# Altium schematic symbol library IC_ADI.SCHLIB: 3169 symbols (part 120 of 181)
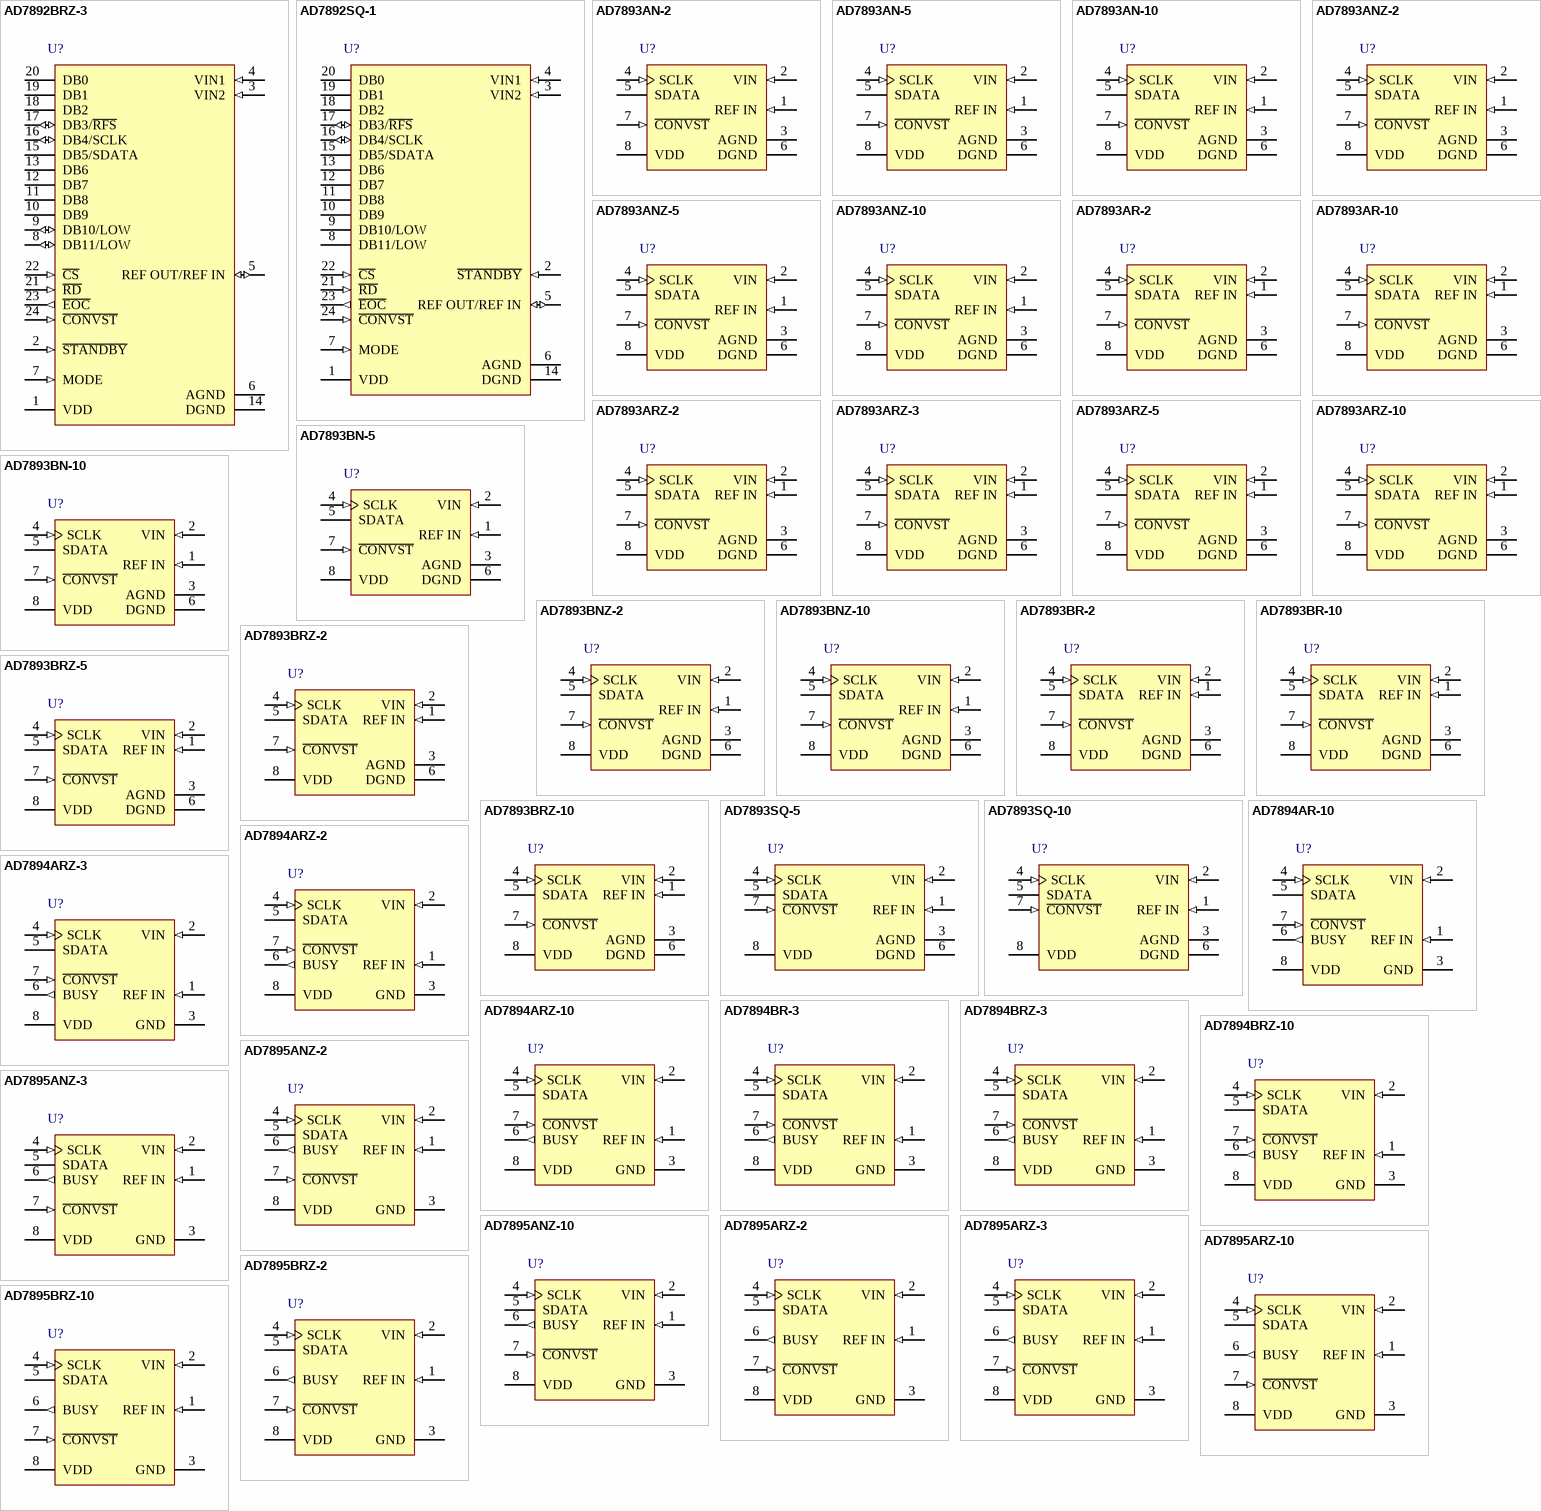
[diagram p310: symbols AD7892BRZ-3 to AD7895BRZ-10]

## AD7895ANZ-3
designator U?
Single 12-Bit Analog-to-Digital Converter with Serial Interface, Serial 3.8 us, 192KSPS, -40 to +125 degC, N-8, Pb-Free, Tube; Generic Part Number: AD7895; PartNumber: AD7895ANZ-3; Resolution (Bits): 12; Channels: 1; Throughput Rate (SPS): 192K; Interface: Ser; DatasheetVersion: Rev.0; PackageVersion: 070606-A; PackageReference: N-8; PackageDescription: 8-Lead Plastic Dual In-Line Package [PDIP] Narrow Body; Supplier Part Number 1: AD7895ANZ-3-ND; Supplier Part Number 2: 584-AD7895ANZ-3; RoHS: Y; Packing: Tube; Mounting Technology: Through-hole; Code_JEDEC: MS-001; ComponentLink1Description: Manufacturer URL; ComponentLink2Description: Datasheet; ComponentLink3Description: Package Specification; ComponentLink4Description: Product URL
footprint DIP8 (Footprint not found)
pins: 1 REF IN (in) "Voltage Reference Input.  An external reference source should be connected to this pin to provide the reference voltage for the AD7895's conversion process. The REF IN input is buffered on chip. The nominal reference voltage (See Datasheet)", 2 VIN (in) "Analog Input Channel.  The analog input range is +/- 10 V (AD7895-10), +/- 2.5 V (AD7895-3) and 0 V to +/- 2.5 V (AD7895-2).", 3 GND (power) "Analog Ground. Ground reference for track/hold, comparator, digital circuitry and DAC.", 4 SCLK (in) "Serial Clock Input.   An external serial clock is applied to this input to obtain serial data from the AD7895.A new serial data bit is clocked out on the falling edge of this serial clock. Data is guaranteed valid for 10 ns (See Datasheet)", 5 SDATA (hiz) "Serial Data Output.  Serial data from the AD7895 is provided at this output. The serial data is clocked out by the falling edge of SCLK, but the data can also be read on the falling edge of SCLK. This is possible because (See Datasheet)", 6 BUSY (out) "The BUSY pin is used to indicate when the part is doing a conversion.  The BUSY pin will go high on the falling edge of C\O\N\V\S\T\ and will return low when the conversion is complete.", 7 ~{CONVST} (in) "Convert Start.  Edge-triggered logic input. On the falling edge of this input, the track/hold goes into its hold mode, and conversion is initiated.  If C\O\N\V\S\T\ is low at the end of conversion, the part goes into power (See Datasheet)", 8 VDD (power) "Positive supply voltage, +5 V +/- 5%."

## AD7895ANZ-10
designator U?
Single 12-Bit Analog-to-Digital Converter with Serial Interface, Serial 3.8 us, 192KSPS, -40 to +85 degC, N-8, Pb-Free, Tube; Generic Part Number: AD7895; PartNumber: AD7895ANZ-10; Resolution (Bits): 12; Channels: 1; Throughput Rate (SPS): 192K; Interface: Ser; DatasheetVersion: Rev.0; PackageVersion: 070606-A; PackageReference: N-8; PackageDescription: 8-Lead Plastic Dual In-Line Package [PDIP] Narrow Body; Supplier Part Number 1: AD7895ANZ-10-ND; Supplier Part Number 2: 59K5911; Supplier Part Number 3: 584-AD7895ANZ-10; RoHS: Y; Packing: Tube; Mounting Technology: Through-hole; Code_JEDEC: MS-001; ComponentLink1Description: Manufacturer URL; ComponentLink2Description: Datasheet; ComponentLink3Description: Package Specification; ComponentLink4Description: Product URL
footprint DIP8 (Footprint not found)
pins: 1 REF IN (in) "Voltage Reference Input.  An external reference source should be connected to this pin to provide the reference voltage for the AD7895's conversion process. The REF IN input is buffered on chip. The nominal reference voltage (See Datasheet)", 2 VIN (in) "Analog Input Channel.  The analog input range is +/- 10 V (AD7895-10), +/- 2.5 V (AD7895-3) and 0 V to +/- 2.5 V (AD7895-2).", 3 GND (power) "Analog Ground. Ground reference for track/hold, comparator, digital circuitry and DAC.", 4 SCLK (in) "Serial Clock Input.   An external serial clock is applied to this input to obtain serial data from the AD7895.A new serial data bit is clocked out on the falling edge of this serial clock. Data is guaranteed valid for 10 ns (See Datasheet)", 5 SDATA (hiz) "Serial Data Output.  Serial data from the AD7895 is provided at this output. The serial data is clocked out by the falling edge of SCLK, but the data can also be read on the falling edge of SCLK. This is possible because (See Datasheet)", 6 BUSY (out) "The BUSY pin is used to indicate when the part is doing a conversion.  The BUSY pin will go high on the falling edge of C\O\N\V\S\T\ and will return low when the conversion is complete.", 7 ~{CONVST} (in) "Convert Start.  Edge-triggered logic input. On the falling edge of this input, the track/hold goes into its hold mode, and conversion is initiated.  If C\O\N\V\S\T\ is low at the end of conversion, the part goes into power (See Datasheet)", 8 VDD (power) "Positive supply voltage, +5 V +/- 5%."

## AD7895ARZ-2
designator U?
Single 12-Bit Analog-to-Digital Converter with Serial Interface, Serial 3.8 us, 192KSPS, -40 to +85 degC, R-8, Pb-Free, Tube; Generic Part Number: AD7895; PartNumber: AD7895ARZ-2; Resolution (Bits): 12; Channels: 1; Throughput Rate (SPS): 192K; Interface: Ser; DatasheetVersion: Rev.0; PackageVersion: 060506-A; PackageReference: R-8; PackageDescription: 8-Lead Standard Small Outline Package [SOIC_N] Narrow Body; Supplier Part Number 1: AD7895ARZ-2-ND; Supplier Part Number 2: 59K5914; Supplier Part Number 3: 584-AD7895ARZ-2; RoHS: Y; Packing: Tube; Mounting Technology: Surface Mount; Code_JEDEC: MS-012-AA; Code_IPC: SOIC127P600-8; ComponentLink1Description: Manufacturer URL; ComponentLink2Description: Datasheet; ComponentLink3Description: Package Specification; ComponentLink4Description: Product URL
footprint SOIC8_1.27 (Footprint not found)
pins: 1 REF IN (in) "Voltage Reference Input.  An external reference source should be connected to this pin to provide the reference voltage for the AD7895's conversion process. The REF IN input is buffered on chip. The nominal reference voltage (See Datasheet)", 2 VIN (in) "Analog Input Channel.  The analog input range is +/- 10 V (AD7895-10), +/- 2.5 V (AD7895-3) and 0 V to +/- 2.5 V (AD7895-2).", 3 GND (power) "Analog Ground. Ground reference for track/hold, comparator, digital circuitry and DAC.", 4 SCLK (in) "Serial Clock Input.   An external serial clock is applied to this input to obtain serial data from the AD7895.A new serial data bit is clocked out on the falling edge of this serial clock. Data is guaranteed valid for 10 ns (See Datasheet)", 5 SDATA (hiz) "Serial Data Output.  Serial data from the AD7895 is provided at this output. The serial data is clocked out by the falling edge of SCLK, but the data can also be read on the falling edge of SCLK. This is possible because (See Datasheet)", 6 BUSY (out) "The BUSY pin is used to indicate when the part is doing a conversion.  The BUSY pin will go high on the falling edge of C\O\N\V\S\T\ and will return low when the conversion is complete.", 7 ~{CONVST} (in) "Convert Start.  Edge-triggered logic input. On the falling edge of this input, the track/hold goes into its hold mode, and conversion is initiated.  If C\O\N\V\S\T\ is low at the end of conversion, the part goes into power (See Datasheet)", 8 VDD (power) "Positive supply voltage, +5 V +/- 5%."

## AD7895ARZ-3
designator U?
Single 12-Bit Analog-to-Digital Converter with Serial Interface, Serial 3.8 us, 192KSPS, -40 to +85 degC, R-8, Pb-Free, Tube; Generic Part Number: AD7895; PartNumber: AD7895ARZ-3; Resolution (Bits): 12; Channels: 1; Throughput Rate (SPS): 192K; Interface: Ser; DatasheetVersion: Rev.0; PackageVersion: 060506-A; PackageReference: R-8; PackageDescription: 8-Lead Standard Small Outline Package [SOIC_N] Narrow Body; Supplier Part Number 1: AD7895ARZ-3-ND; Supplier Part Number 2: 59K5916; Supplier Part Number 3: 584-AD7895ARZ-3; RoHS: Y; Packing: Tube; Mounting Technology: Surface Mount; Code_JEDEC: MS-012-AA; Code_IPC: SOIC127P600-8; ComponentLink1Description: Manufacturer URL; ComponentLink2Description: Datasheet; ComponentLink3Description: Package Specification; ComponentLink4Description: Product URL
footprint SOIC8_1.27 (Footprint not found)
pins: 1 REF IN (in) "Voltage Reference Input.  An external reference source should be connected to this pin to provide the reference voltage for the AD7895's conversion process. The REF IN input is buffered on chip. The nominal reference voltage (See Datasheet)", 2 VIN (in) "Analog Input Channel.  The analog input range is +/- 10 V (AD7895-10), +/- 2.5 V (AD7895-3) and 0 V to +/- 2.5 V (AD7895-2).", 3 GND (power) "Analog Ground. Ground reference for track/hold, comparator, digital circuitry and DAC.", 4 SCLK (in) "Serial Clock Input.   An external serial clock is applied to this input to obtain serial data from the AD7895.A new serial data bit is clocked out on the falling edge of this serial clock. Data is guaranteed valid for 10 ns (See Datasheet)", 5 SDATA (hiz) "Serial Data Output.  Serial data from the AD7895 is provided at this output. The serial data is clocked out by the falling edge of SCLK, but the data can also be read on the falling edge of SCLK. This is possible because (See Datasheet)", 6 BUSY (out) "The BUSY pin is used to indicate when the part is doing a conversion.  The BUSY pin will go high on the falling edge of C\O\N\V\S\T\ and will return low when the conversion is complete.", 7 ~{CONVST} (in) "Convert Start.  Edge-triggered logic input. On the falling edge of this input, the track/hold goes into its hold mode, and conversion is initiated.  If C\O\N\V\S\T\ is low at the end of conversion, the part goes into power (See Datasheet)", 8 VDD (power) "Positive supply voltage, +5 V +/- 5%."

## AD7895ARZ-10
designator U?
Single 12-Bit Analog-to-Digital Converter with Serial Interface, Serial 3.8 us, 192KSPS, -40 to +85 degC, R-8, Pb-Free, Tube; Generic Part Number: AD7895; PartNumber: AD7895ARZ-10; Resolution (Bits): 12; Channels: 1; Throughput Rate (SPS): 192K; Interface: Ser; DatasheetVersion: Rev.0; PackageVersion: 060506-A; PackageReference: R-8; PackageDescription: 8-Lead Standard Small Outline Package [SOIC_N] Narrow Body; Supplier Part Number 1: AD7895ARZ-10-ND; Supplier Part Number 2: 88H0071; Supplier Part Number 3: 584-AD7895ARZ-10; RoHS: Y; Packing: Tube; Mounting Technology: Surface Mount; Code_JEDEC: MS-012-AA; Code_IPC: SOIC127P600-8; ComponentLink1Description: Manufacturer URL; ComponentLink2Description: Datasheet; ComponentLink3Description: Package Specification; ComponentLink4Description: Product URL
footprint SOIC8_1.27 (Footprint not found)
pins: 1 REF IN (in) "Voltage Reference Input.  An external reference source should be connected to this pin to provide the reference voltage for the AD7895's conversion process. The REF IN input is buffered on chip. The nominal reference voltage (See Datasheet)", 2 VIN (in) "Analog Input Channel.  The analog input range is +/- 10 V (AD7895-10), +/- 2.5 V (AD7895-3) and 0 V to +/- 2.5 V (AD7895-2).", 3 GND (power) "Analog Ground. Ground reference for track/hold, comparator, digital circuitry and DAC.", 4 SCLK (in) "Serial Clock Input.   An external serial clock is applied to this input to obtain serial data from the AD7895.A new serial data bit is clocked out on the falling edge of this serial clock. Data is guaranteed valid for 10 ns (See Datasheet)", 5 SDATA (hiz) "Serial Data Output.  Serial data from the AD7895 is provided at this output. The serial data is clocked out by the falling edge of SCLK, but the data can also be read on the falling edge of SCLK. This is possible because (See Datasheet)", 6 BUSY (out) "The BUSY pin is used to indicate when the part is doing a conversion.  The BUSY pin will go high on the falling edge of C\O\N\V\S\T\ and will return low when the conversion is complete.", 7 ~{CONVST} (in) "Convert Start.  Edge-triggered logic input. On the falling edge of this input, the track/hold goes into its hold mode, and conversion is initiated.  If C\O\N\V\S\T\ is low at the end of conversion, the part goes into power (See Datasheet)", 8 VDD (power) "Positive supply voltage, +5 V +/- 5%."

## AD7895BRZ-2
designator U?
Single 12-Bit Analog-to-Digital Converter with Serial Interface, Serial 3.8 us, 192KSPS, -40 to +85 degC, R-8, Pb-Free, Tube; Generic Part Number: AD7895; PartNumber: AD7895BRZ-2; Resolution (Bits): 12; Channels: 1; Throughput Rate (SPS): 192K; Interface: Ser; DatasheetVersion: Rev.0; PackageVersion: 060506-A; PackageReference: R-8; PackageDescription: 8-Lead Standard Small Outline Package [SOIC_N] Narrow Body; Supplier Part Number 1: AD7895BRZ-2-ND; Supplier Part Number 2: 584-AD7895BRZ-2; RoHS: Y; Packing: Tube; Mounting Technology: Surface Mount; Code_JEDEC: MS-012-AA; Code_IPC: SOIC127P600-8; ComponentLink1Description: Manufacturer URL; ComponentLink2Description: Datasheet; ComponentLink3Description: Package Specification; ComponentLink4Description: Product URL
footprint SOIC8_1.27 (Footprint not found)
pins: 1 REF IN (in) "Voltage Reference Input.  An external reference source should be connected to this pin to provide the reference voltage for the AD7895's conversion process. The REF IN input is buffered on chip. The nominal reference voltage (See Datasheet)", 2 VIN (in) "Analog Input Channel.  The analog input range is +/- 10 V (AD7895-10), +/- 2.5 V (AD7895-3) and 0 V to +/- 2.5 V (AD7895-2).", 3 GND (power) "Analog Ground. Ground reference for track/hold, comparator, digital circuitry and DAC.", 4 SCLK (in) "Serial Clock Input.   An external serial clock is applied to this input to obtain serial data from the AD7895.A new serial data bit is clocked out on the falling edge of this serial clock. Data is guaranteed valid for 10 ns (See Datasheet)", 5 SDATA (hiz) "Serial Data Output.  Serial data from the AD7895 is provided at this output. The serial data is clocked out by the falling edge of SCLK, but the data can also be read on the falling edge of SCLK. This is possible because (See Datasheet)", 6 BUSY (out) "The BUSY pin is used to indicate when the part is doing a conversion.  The BUSY pin will go high on the falling edge of C\O\N\V\S\T\ and will return low when the conversion is complete.", 7 ~{CONVST} (in) "Convert Start.  Edge-triggered logic input. On the falling edge of this input, the track/hold goes into its hold mode, and conversion is initiated.  If C\O\N\V\S\T\ is low at the end of conversion, the part goes into power (See Datasheet)", 8 VDD (power) "Positive supply voltage, +5 V +/- 5%."

## AD7895BRZ-10
designator U?
Single 12-Bit Analog-to-Digital Converter with Serial Interface, Serial 3.8 us, 192KSPS, -40 to +85 degC, R-8, Pb-Free, Tube; Generic Part Number: AD7895; PartNumber: AD7895BRZ-10; Resolution (Bits): 12; Channels: 1; Throughput Rate (SPS): 192K; Interface: Ser; DatasheetVersion: Rev.0; PackageVersion: 060506-A; PackageReference: R-8; PackageDescription: 8-Lead Standard Small Outline Package [SOIC_N] Narrow Body; Supplier Part Number 1: AD7895BRZ-10-ND; Supplier Part Number 2: 584-AD7895BRZ-10; RoHS: Y; Packing: Tube; Mounting Technology: Surface Mount; Code_JEDEC: MS-012-AA; Code_IPC: SOIC127P600-8; ComponentLink1Description: Manufacturer URL; ComponentLink2Description: Datasheet; ComponentLink3Description: Package Specification; ComponentLink4Description: Product URL
footprint SOIC8_1.27 (Footprint not found)
pins: 1 REF IN (in) "Voltage Reference Input.  An external reference source should be connected to this pin to provide the reference voltage for the AD7895's conversion process. The REF IN input is buffered on chip. The nominal reference voltage (See Datasheet)", 2 VIN (in) "Analog Input Channel.  The analog input range is +/- 10 V (AD7895-10), +/- 2.5 V (AD7895-3) and 0 V to +/- 2.5 V (AD7895-2).", 3 GND (power) "Analog Ground. Ground reference for track/hold, comparator, digital circuitry and DAC.", 4 SCLK (in) "Serial Clock Input.   An external serial clock is applied to this input to obtain serial data from the AD7895.A new serial data bit is clocked out on the falling edge of this serial clock. Data is guaranteed valid for 10 ns (See Datasheet)", 5 SDATA (hiz) "Serial Data Output.  Serial data from the AD7895 is provided at this output. The serial data is clocked out by the falling edge of SCLK, but the data can also be read on the falling edge of SCLK. This is possible because (See Datasheet)", 6 BUSY (out) "The BUSY pin is used to indicate when the part is doing a conversion.  The BUSY pin will go high on the falling edge of C\O\N\V\S\T\ and will return low when the conversion is complete.", 7 ~{CONVST} (in) "Convert Start.  Edge-triggered logic input. On the falling edge of this input, the track/hold goes into its hold mode, and conversion is initiated.  If C\O\N\V\S\T\ is low at the end of conversion, the part goes into power (See Datasheet)", 8 VDD (power) "Positive supply voltage, +5 V +/- 5%."

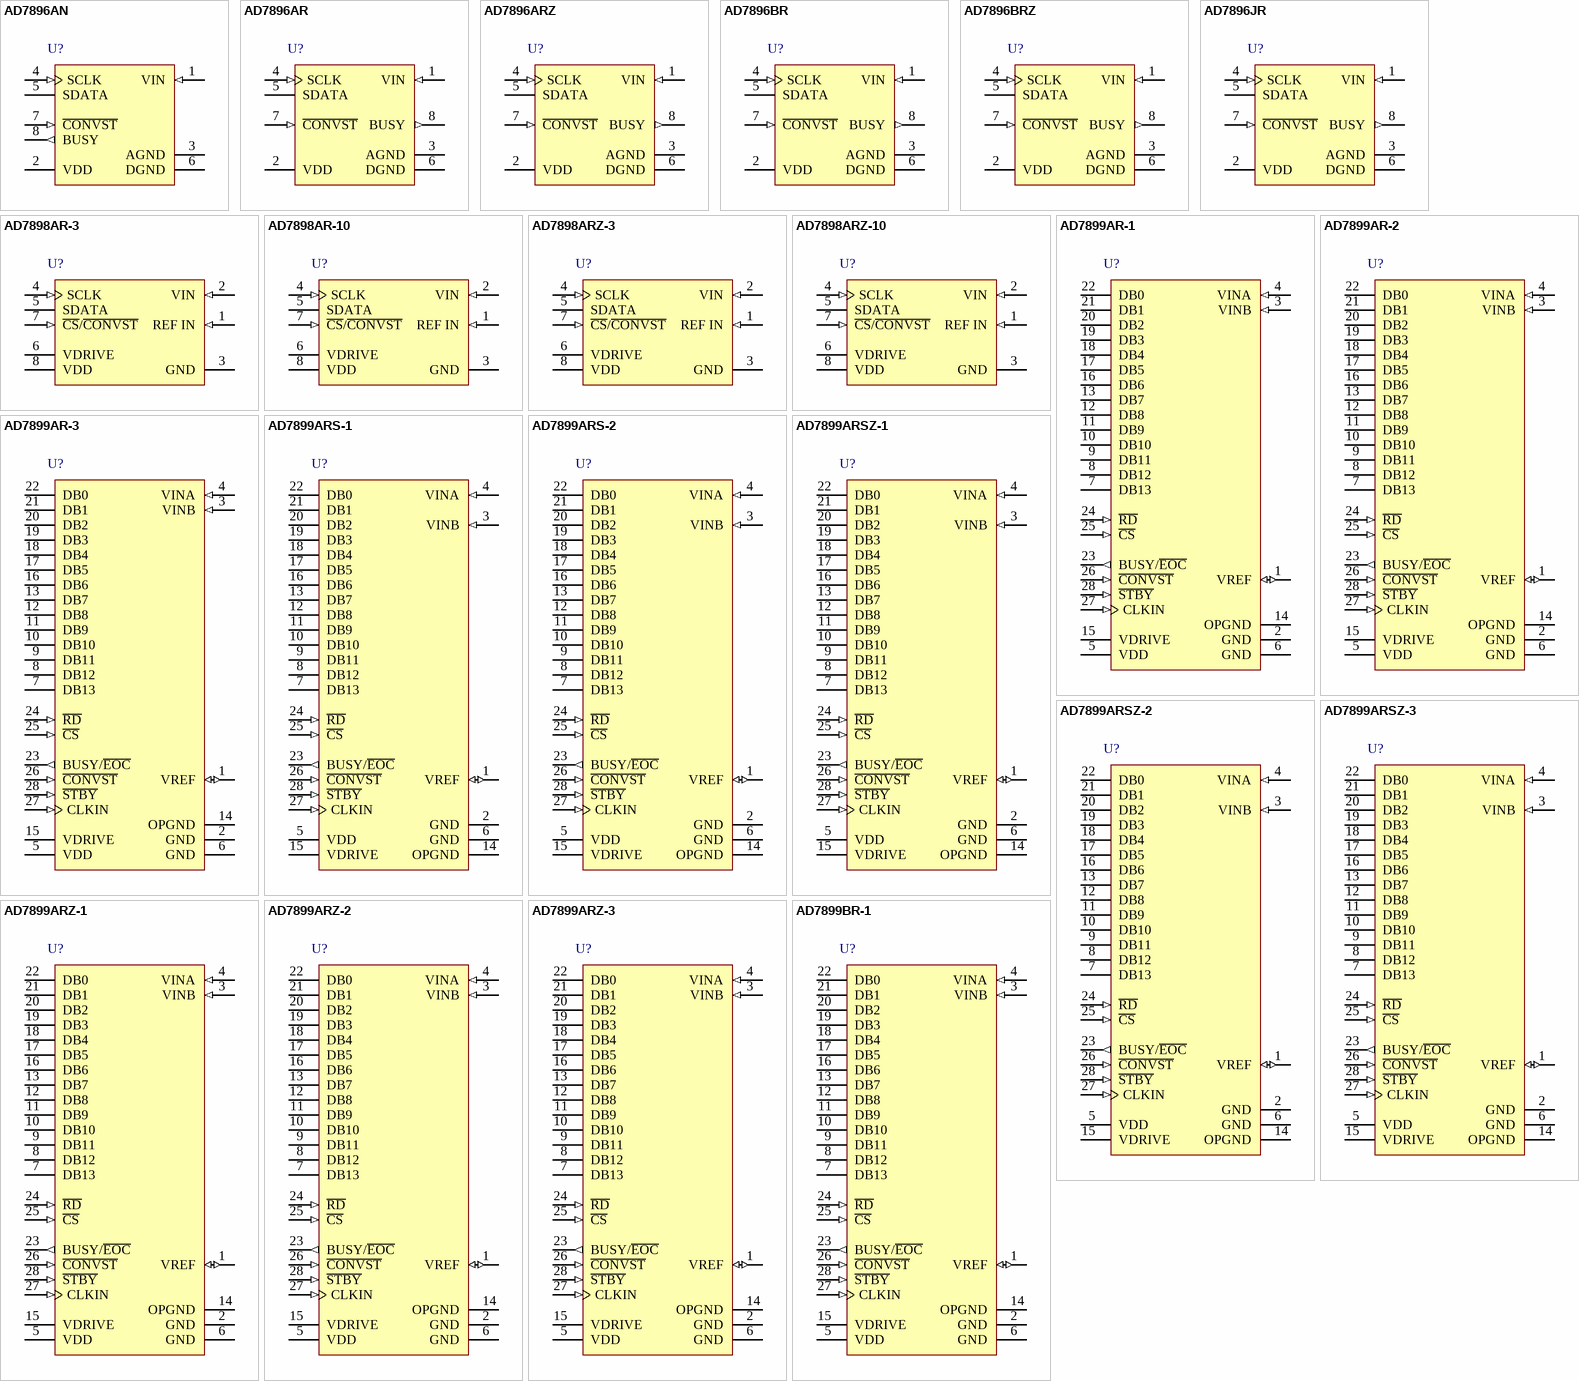
[diagram p85: symbols AD7896AN to AD7899BR-1]

## AD7896AN
designator U?
Single 12-Bit Analog-to-Digital Converter with Serial Interface, 8 us, 2.7 V to 5.5 V, 100KSPS, -40 to +85 degC, N-8, Tube; Generic Part Number: AD7896; PartNumber: AD7896AN; Resolution (Bits): 12; Channels: 1; Throughput Rate (SPS): 100K; Interface: Ser; DatasheetVersion: Rev.D; PackageVersion: 070606-A; PackageReference: N-8; PackageDescription: 8-Lead Plastic Dual In-Line Package [PDIP] Narrow Body; Supplier Part Number 1: AD7896AN-ND; RoHS: N; Packing: Tube; Mounting Technology: Through-hole; Code_JEDEC: MS-001; ComponentLink1Description: Manufacturer URL; ComponentLink2Description: Datasheet; ComponentLink3Description: Package Specification; ComponentLink4Description: Product URL
footprint DIP8 (Footprint not found)
pins: 1 VIN (in) "Analog Input. The analog input range is 0 V to VDD.", 2 VDD (power) "Positive supply voltage, 2.7 V to 5.5 V.", 3 AGND (power) "Analog Ground. Ground reference for track-and-hold, comparator, and DAC.", 4 SCLK (in) "Serial Clock Input. An external serial clock is applied to this input to obtain serial data from the AD7896. A new serial data bit is clocked out on the falling edge of this serial clock. Data is guaranteed valid for 10 ns (See Datasheet)", 5 SDATA (hiz) "Serial Data Output.  Serial data from the AD7896 is provided at this output. The serial data is clocked out by the falling edge of SCLK, but the data can also be read on the falling edge of the SCLK. This is possible because (See Datasheet)", 6 DGND (power) "Digital Ground. Ground reference for digital circuitry.", 7 ~{CONVST} (in) "Convert Start. Edge-triggered logic input. On the falling edge of this input, the track-and-hold goes into its hold mode and conversion is initiated. If C\O\N\V\S\T\ is low at the end of conversion, the part goes into (See Datasheet)", 8 BUSY (out) "The BUSY pin is used to indicate when the part is doing a conversion. The BUSY pin goes high on the falling edge of C\O\N\V\S\T\ and returns low when the conversion is complete."

## AD7896AR
designator U?
Single 12-Bit Analog-to-Digital Converter with Serial Interface, 8 us, 2.7 V to 5.5 V, 100KSPS, -40 to +85 degC, R-8, Tube; Generic Part Number: AD7896; PartNumber: AD7896AR; Resolution (Bits): 12; Channels: 1; Throughput Rate (SPS): 100K; Interface: Ser; DatasheetVersion: Rev.D; PackageVersion: 060506-A; PackageReference: R-8; PackageDescription: 8-Lead Standard Small Outline Package [SOIC_N] Narrow Body; Supplier Part Number 1: AD7896AR-ND; Supplier Part Number 2: 584-AD7896AR; RoHS: N; Packing: Tube; Mounting Technology: Surface Mount; Code_JEDEC: MS-012-AA; Code_IPC: SOIC127P600-8; ComponentLink1Description: Manufacturer URL; ComponentLink2Description: Datasheet; ComponentLink3Description: Package Specification; ComponentLink4Description: Product URL
footprint SOIC8_1.27 (Footprint not found)
pins: 1 VIN (in) "Analog Input. The analog input range is 0 V to VDD.", 2 VDD (power) "Positive supply voltage, 2.7 V to 5.5 V", 3 AGND (power) "Analog Ground. Ground reference for track-and-hold, comparator, and DAC.", 4 SCLK (in) "Serial Clock Input. An external serial clock is applied to this input to obtain serial data from the AD7896. A new serial data bit is clocked out on the falling edge of this serial clock. Data is guaranteed valid for 10 ns (See Datasheet)", 5 SDATA (hiz) "Serial Data Output.  Serial data from the AD7896 is provided at this output. The serial data is clocked out by the falling edge of SCLK, but the data can also be read on the falling edge of the SCLK. This is possible because (See Datasheet)", 6 DGND (power) "Digital Ground. Ground reference for digital circuitry", 7 ~{CONVST} (in) "Convert Start. Edge-triggered logic input. On the falling edge of this input, the track-and-hold goes into its hold mode and conversion is initiated. If C\O\N\V\S\T\ is low at the end of conversion, the part goes into (See Datasheet)", 8 BUSY (out) "The BUSY pin is used to indicate when the part is doing a conversion. The BUSY pin goes high on the falling edge of C\O\N\V\S\T\ and returns low when the conversion is complete."

## AD7896ARZ
designator U?
Single 12-Bit Analog-to-Digital Converter with Serial Interface, 8 us, 2.7 V to 5.5 V, 100KSPS, -40 to +85 degC, R-8, Pb-Free, Tube; Generic Part Number: AD7896; PartNumber: AD7896ARZ; Resolution (Bits): 12; Channels: 1; Throughput Rate (SPS): 100K; Interface: Ser; DatasheetVersion: Rev.D; PackageVersion: 060506-A; PackageReference: R-8; PackageDescription: 8-Lead Standard Small Outline Package [SOIC_N] Narrow Body; Supplier Part Number 1: AD7896ARZ-ND; Supplier Part Number 2: 2305577; Supplier Part Number 3: 84W7459; Supplier Part Number 4: 584-AD7896ARZ; RoHS: Y; Packing: Tube; Mounting Technology: Surface Mount; Code_JEDEC: MS-012-AA; Code_IPC: SOIC127P600-8; ComponentLink1Description: Manufacturer URL; ComponentLink2Description: Datasheet; ComponentLink3Description: Package Specification; ComponentLink4Description: Product URL
footprint SOIC8_1.27 (Footprint not found)
pins: 1 VIN (in) "Analog Input. The analog input range is 0 V to VDD.", 2 VDD (power) "Positive supply voltage, 2.7 V to 5.5 V", 3 AGND (power) "Analog Ground. Ground reference for track-and-hold, comparator, and DAC.", 4 SCLK (in) "Serial Clock Input. An external serial clock is applied to this input to obtain serial data from the AD7896. A new serial data bit is clocked out on the falling edge of this serial clock. Data is guaranteed valid for 10 ns (See Datasheet)", 5 SDATA (hiz) "Serial Data Output.  Serial data from the AD7896 is provided at this output. The serial data is clocked out by the falling edge of SCLK, but the data can also be read on the falling edge of the SCLK. This is possible because (See Datasheet)", 6 DGND (power) "Digital Ground. Ground reference for digital circuitry", 7 ~{CONVST} (in) "Convert Start. Edge-triggered logic input. On the falling edge of this input, the track-and-hold goes into its hold mode and conversion is initiated. If C\O\N\V\S\T\ is low at the end of conversion, the part goes into (See Datasheet)", 8 BUSY (out) "The BUSY pin is used to indicate when the part is doing a conversion. The BUSY pin goes high on the falling edge of C\O\N\V\S\T\ and returns low when the conversion is complete."